# Altium schematic symbol library LATTICEPLDS_Library.SchLib: 291 symbols (part 10 of 32) (continued)
## LFE2M-35/50-F672 (continued)
part F pins: A3 PT13A (io), A4 PT13B (io), A5 PT14A (io), A6 PT14B (io), A7 PT19A (io), A8 PT22A (io), A9 PT24B (io), A10 PT32B / PT41B (io), A11 PT35A / PT44A (io), A12 PT35B / PT44B (io), B2 PT6B (io), B3 PT7B (io), B7 VCCIO0 (io), B8 PT19B (io), B9 PT22B (io), B10 PT32A / PT41A (io), B12 VCCIO0 (io), C3 PT4B (io), C4 PT6A (io), C5 PT7A (io), C6 PT12B (io), C7 PT17A (io), C8 PT16B (io), C9 PT20A (io), C10 PT23B (io), C11 PT36B / PT45B (io), C12 PT37B / PT46B (io), D4 PT4A (io), D5 PT10B (io), D6 PT17B (io), D7 PT11B (io), D8 PT15B (io), D9 PT18B (io), D10 PT29B / PT38B (io), D11 PT31B / PT40B (io), D12 PT34B / PT43B (io), D13 PT40A / PT49A (io), D14 PT40B / PT49B (io), D15 PT43A / PT52A (io), D16 PT45A / PT54A (io), D17 PT46A / PT55A (io), D18 VCCIO1 (io), E6 PT10A (io), E7 PT8A (io), E8 PT23A (io), E10 PT21A (io), E11 PT30B / PT39B (io), E12 PT39A / PT48A (io), E13 PT38A / PT47A (io), E14 PT41A / PT50A (io), E15 PT42A / PT51A (io), E16 PT43B / PT52B (io), E17 PT46B / PT55B (io), F7 PT5A (io), F8 PT3A (io), F9 PT9A (io), F10 PT12A (io), F11 VCCIO0 (io), F12 PT21B (io), F13 PT30A / PT39A (io), F14 PT36A / PT45A (io), F15 PT39B / PT48B (io), F16 VCCIO1 (io), F17 PT45B / PT54B (io), F18 PT44A / PT53A (io), F19 PT44B / PT53B (io), G7 PT2A (io), G8 PT2B (io), G9 PT5B (io), G10 PT9B (io), G12 PT16A (io), G13 PT20B (io), G14 PT31A / PT40A (io), G15 PT37A / PT46A (io), G17 PT41B / PT50B (io), G18 PT42B / PT51B (io), H10 PT8B (io), H11 PT11A (io), H12 PT15A (io), H13 PT18A (io), H14 PT29A / PT38A (io), H15 PT33A / PT42A (io), H16 PT34A / PT43A (io), H17 PT38B / PT47B (io), H18 PT33B / PT42B (io), J10 PT3B (io), J13 VCCIO0 (io), J14 VCCIO1 (io), K12 VCCIO0 (io), K15 VCCIO1 (io)
part A text: BANK7; (1 of 6); BANK6; Pad Name = PL{-35/-50}
part B text: BANK5; (2 of 6); BANK4; Pad Name = PB{-35/-50}
part C text: BANK8/3; (3 of 6); BANK2; Pad Name = PR{-35/-50}
part D text: (3 of 6); SERDES1
part E text: (4 of 6)
part F text: BANK1; (6 of 6); BANK0; Pad Name = PT{-35/-50}

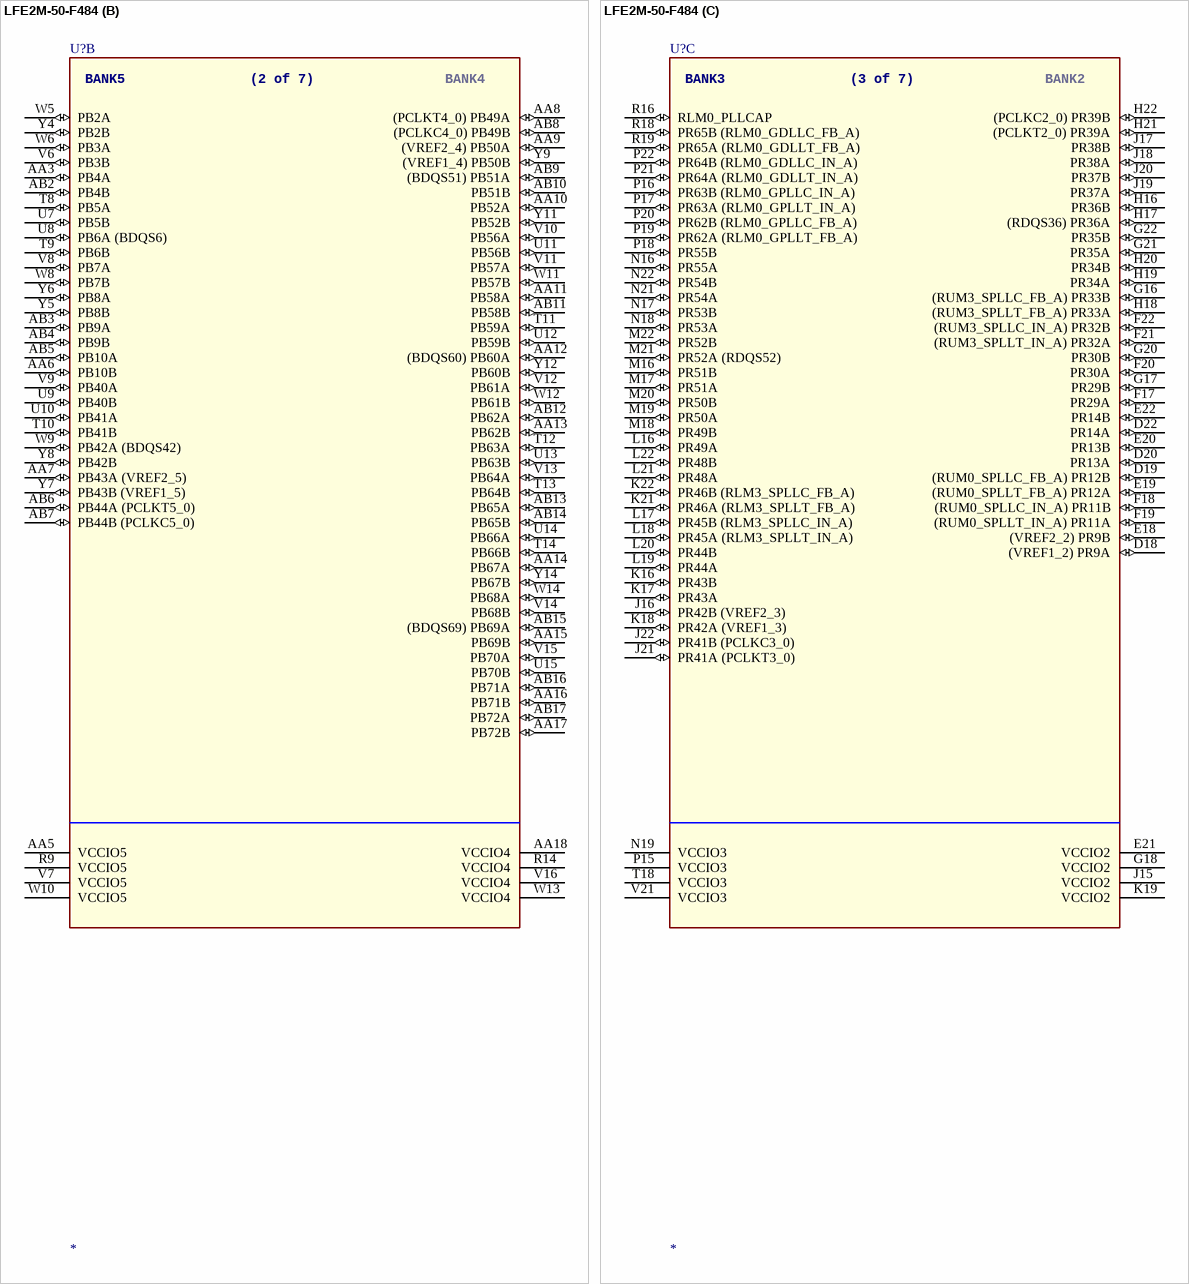
[diagram p105: symbol LFE2M-50-F484]

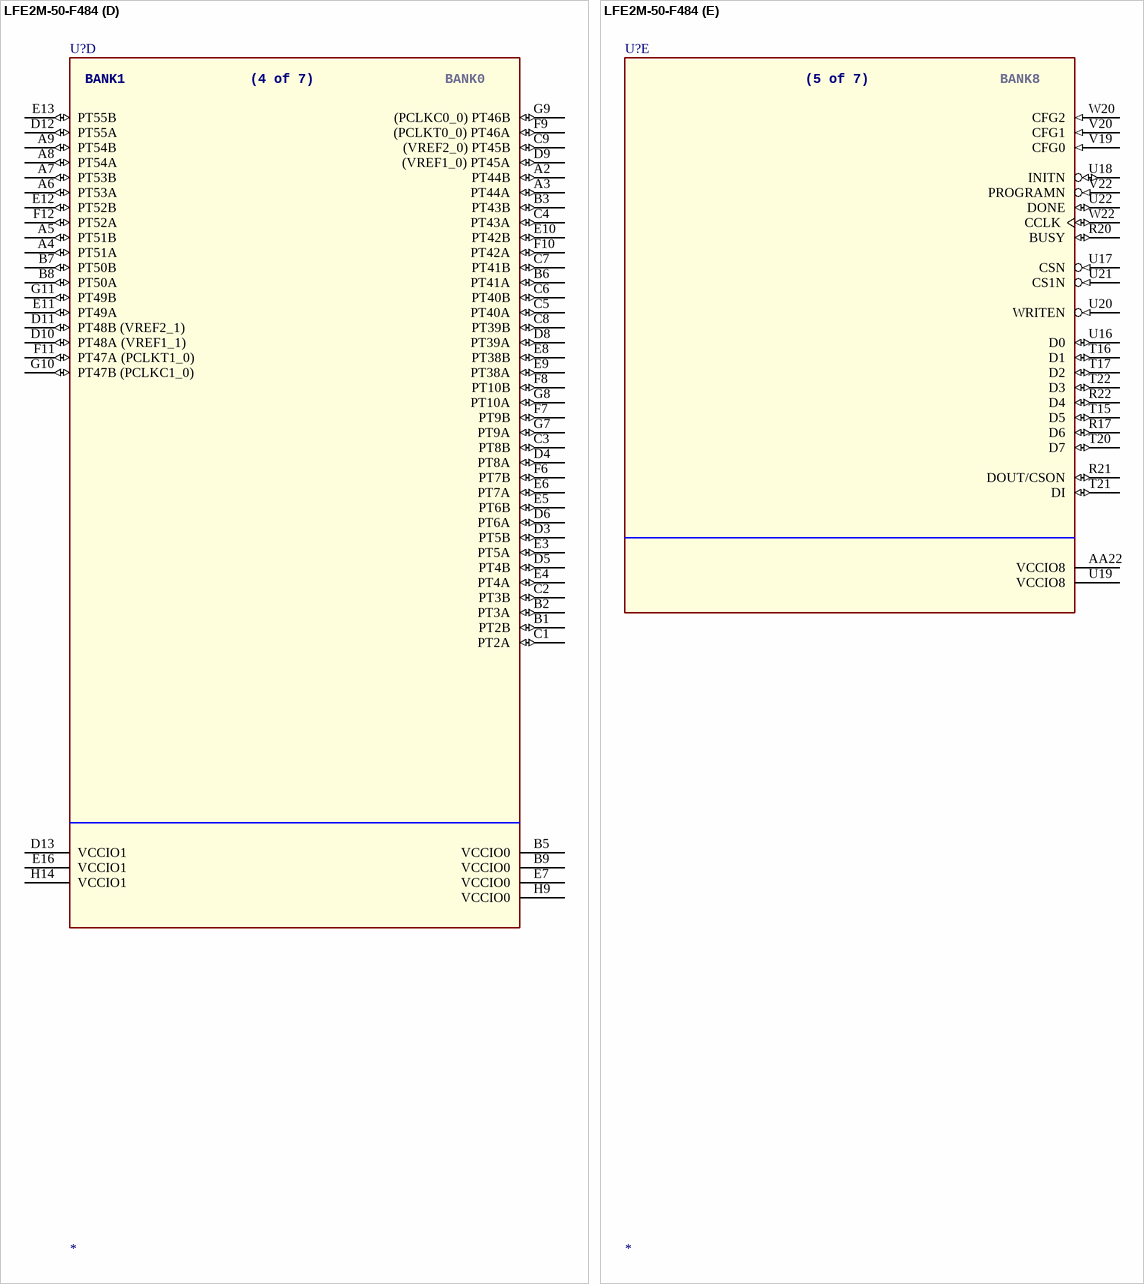
[diagram p106: symbol LFE2M-50-F484]

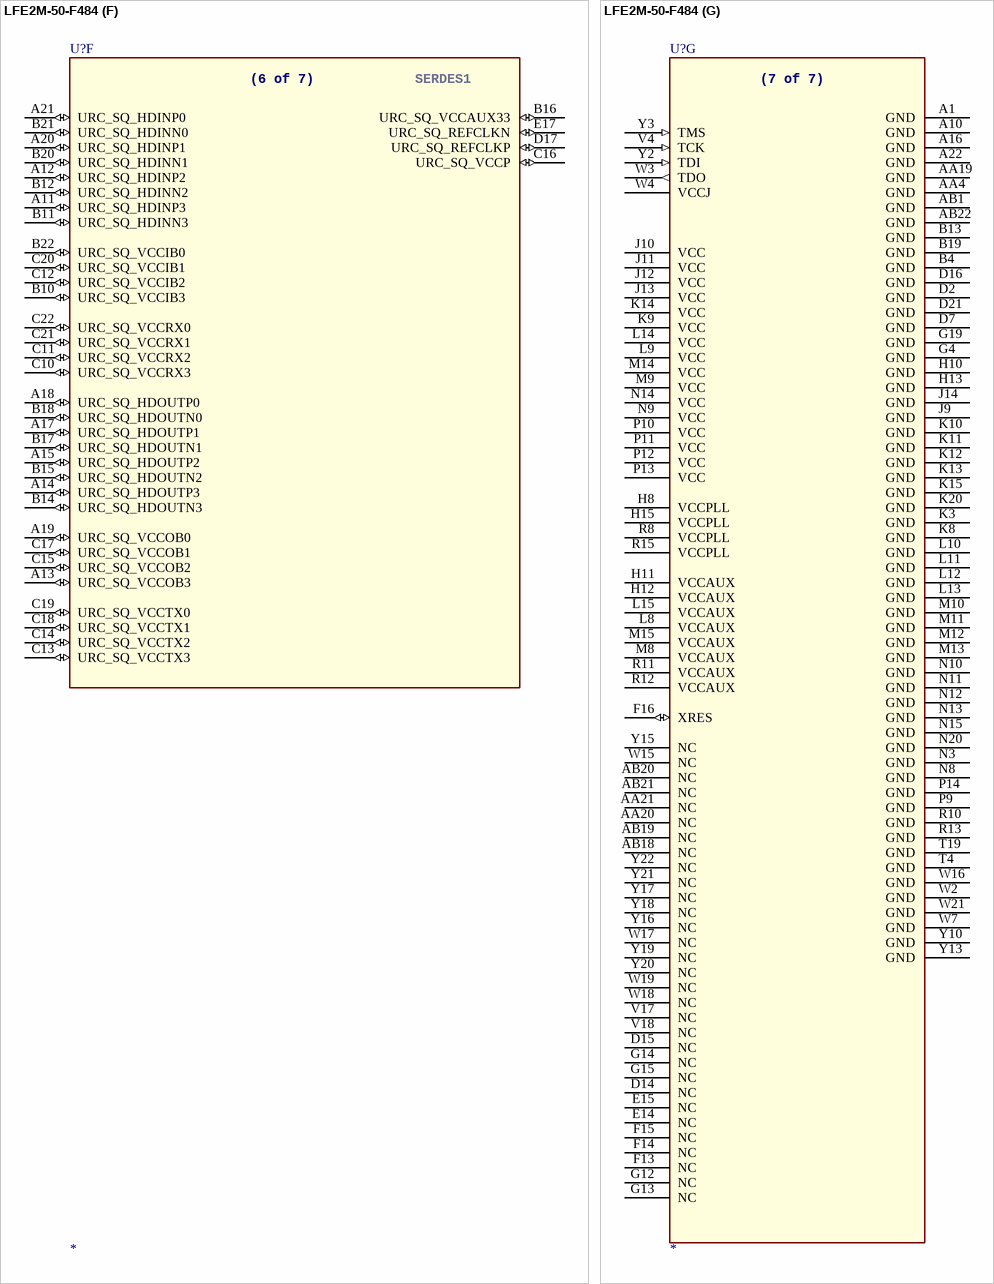
[diagram p107: symbol LFE2M-50-F484]

## LFE2M-50-F484
designator U?
SPLIT_INST: TRUE; SWAP_INFO: (S1+S2+S3+S4+S5+S6+S7)
part A pins: AA1 PL74A (io), AA2 PL74B (io), D1 PL2A (io), E1 PL2B (io), E2 VCCIO7 (power), F1 PL3A (io), F2 PL3B (io), F3 PL5B (io), F4 PL5A (io), F5 PL4A (io), G1 PL6A (LDQS6) (io), G2 PL6B (io), G3 PL9A (VREF2_7) (io), G5 VCCIO7 (power), G6 PL4B (io), H1 PL7A (io), H2 PL7B (io), H3 PL9B (VREF1_7) (io), H4 PL11B (LUM0_SPLLC_IN_A) (io), H5 PL11A (LUM0_SPLLT_IN_A) (io), H6 PL8B (io), H7 PL8A (io), J1 PL12A (LUM0_SPLLT_FB_A) (io), J2 PL12B (LUM0_SPLLC_FB_A) (io), J3 PL13A (io), J4 PL13B (io), J5 PL33A (LUM3_SPLLT_FB_A) (io), J6 PL14B (io), J7 PL14A (io), J8 VCCIO7 (power), K1 PL32A (LUM3_SPLLT_IN_A) (io), K2 PL32B (LUM3_SPLLC_IN_A) (io), K4 VCCIO7 (power), K5 PL33B (LUM3_SPLLC_FB_A) (io), K6 PL34B (io), K7 PL34A (io), L1 PL36A (LDQS36) (io), L2 PL36B (io), L3 PL38A (io), L4 PL38B (io), L5 PL37B (io), L6 PL35A (io), L7 PL35B (io), M1 PL39A (PCLKT7_0) (io), M2 PL39B (PCLKC7_0) (io), M3 (VREF2_6) PL42A (io), M4 (VREF1_6) PL42B (io), M5 (PCLKC6_0) PL41B (io), M6 (PCLKT6_0) PL41A (io), M7 PL37A (io), N1 (LLM3_SPLLT_FB_A) PL46A (io), N2 (LLM3_SPLLC_FB_A) PL46B (io), N4 VCCIO6 (power), N5 PL52B (io), N6 (LLM3_SPLLC_IN_A) PL45B (io), N7 (LLM3_SPLLT_IN_A) PL45A (io), P1 PL53A (io), P2 PL53B (io), P3 PL54A (io), P4 PL54B (io), P5 PL55A (io), P6 (LDQS52) PL52A (io), P7 PL55B (io), P8 VCCIO6 (power), R1 (LLM0_GPLLT_IN_A) PL62A (io), R2 (LLM0_GPLLC_IN_A) PL62B (io), R3 (LLM0_GPLLT_FB_A) PL63A (io), R4 (LLM0_GPLLC_FB_A) PL63B (io), R5 (LLM0_GDLLC_IN_A) PL64B (io), R6 (LLM0_GDLLT_IN_A) PL64A (io), R7 LLM0_PLLCAP (io), T1 (LLM0_GDLLT_FB_A) PL65A (io), T2 (LLM0_GDLLC_FB_A) PL65B (io), T3 PL69A (io), T5 VCCIO6 (power), T6 PL67A (io), T7 PL67B (io), U1 PL68A (io), U2 PL68B (io), U3 PL69B (io), U4 PL71B (io), U5 PL70B (io), U6 PL70A (io), V1 PL72A (io), V2 VCCIO6 (power), V3 PL72B (io), V5 (LDQS71) PL71A (io), W1 PL73A (io), Y1 PL73B (io)
part B pins: AA3 PB4A (io), AA5 VCCIO5 (power), AA6 PB10B (io), AA7 PB43A (VREF2_5) (io), AA8 (PCLKT4_0) PB49A (io), AA9 (VREF2_4) PB50A (io), AA10 PB52A (io), AA11 PB58A (io), AA12 (BDQS60) PB60A (io), AA13 PB62B (io), AA14 PB67A (io), AA15 PB69B (io), AA16 PB71B (io), AA17 PB72B (io), AA18 VCCIO4 (power), AB2 PB4B (io), AB3 PB9A (io), AB4 PB9B (io), AB5 PB10A (io), AB6 PB44A (PCLKT5_0) (io), AB7 PB44B (PCLKC5_0) (io), AB8 (PCLKC4_0) PB49B (io), AB9 (BDQS51) PB51A (io), AB10 PB51B (io), AB11 PB58B (io), AB12 PB62A (io), AB13 PB65A (io), AB14 PB65B (io), AB15 (BDQS69) PB69A (io), AB16 PB71A (io), AB17 PB72A (io), R9 VCCIO5 (power), R14 VCCIO4 (power), T8 PB5A (io), T9 PB6B (io), T10 PB41B (io), T11 PB59A (io), T12 PB63A (io), T13 PB64B (io), T14 PB66B (io), U7 PB5B (io), U8 PB6A (BDQS6) (io), U9 PB40B (io), U10 PB41A (io), U11 PB56B (io), U12 PB59B (io), U13 PB63B (io), U14 PB66A (io), U15 PB70B (io), V6 PB3B (io), V7 VCCIO5 (power), V8 PB7A (io), V9 PB40A (io), V10 PB56A (io), V11 PB57A (io), V12 PB61A (io), V13 PB64A (io), V14 PB68B (io), V15 PB70A (io), V16 VCCIO4 (power), W5 PB2A (io), W6 PB3A (io), W8 PB7B (io), W9 PB42A (BDQS42) (io), W10 VCCIO5 (power), W11 PB57B (io), W12 PB61B (io), W13 VCCIO4 (power), W14 PB68A (io), Y4 PB2B (io), Y5 PB8B (io), Y6 PB8A (io), Y7 PB43B (VREF1_5) (io), Y8 PB42B (io), Y9 (VREF1_4) PB50B (io), Y11 PB52B (io), Y12 PB60B (io), Y14 PB67B (io)
part C pins: D18 (VREF1_2) PR9A (io), D19 (RUM0_SPLLC_FB_A) PR12B (io), D20 PR13A (io), D22 PR14A (io), E18 (VREF2_2) PR9B (io), E19 (RUM0_SPLLT_FB_A) PR12A (io), E20 PR13B (io), E21 VCCIO2 (power), E22 PR14B (io), F17 PR29A (io), F18 (RUM0_SPLLC_IN_A) PR11B (io), F19 (RUM0_SPLLT_IN_A) PR11A (io), F20 PR30A (io), F21 (RUM3_SPLLT_IN_A) PR32A (io), F22 (RUM3_SPLLC_IN_A) PR32B (io), G16 (RUM3_SPLLC_FB_A) PR33B (io), G17 PR29B (io), G18 VCCIO2 (power), G20 PR30B (io), G21 PR35A (io), G22 PR35B (io), H16 PR36B (io), H17 (RDQS36) PR36A (io), H18 (RUM3_SPLLT_FB_A) PR33A (io), H19 PR34A (io), H20 PR34B (io), H21 (PCLKT2_0) PR39A (io), H22 (PCLKC2_0) PR39B (io), J15 VCCIO2 (power), J16 PR42B (VREF2_3) (io), J17 PR38B (io), J18 PR38A (io), J19 PR37A (io), J20 PR37B (io), J21 PR41A (PCLKT3_0) (io), J22 PR41B (PCLKC3_0) (io), K16 PR43B (io), K17 PR43A (io), K18 PR42A (VREF1_3) (io), K19 VCCIO2 (power), K21 PR46A (RLM3_SPLLT_FB_A) (io), K22 PR46B (RLM3_SPLLC_FB_A) (io), L16 PR49A (io), L17 PR45B (RLM3_SPLLC_IN_A) (io), L18 PR45A (RLM3_SPLLT_IN_A) (io), L19 PR44A (io), L20 PR44B (io), L21 PR48A (io), L22 PR48B (io), M16 PR51B (io), M17 PR51A (io), M18 PR49B (io), M19 PR50A (io), M20 PR50B (io), M21 PR52A (RDQS52) (io), M22 PR52B (io), N16 PR55A (io), N17 PR53B (io), N18 PR53A (io), N19 VCCIO3 (power), N21 PR54A (io), N22 PR54B (io), P15 VCCIO3 (power), P16 PR63B (RLM0_GPLLC_IN_A) (io), P17 PR63A (RLM0_GPLLT_IN_A) (io), P18 PR55B (io), P19 PR62A (RLM0_GPLLT_FB_A) (io), P20 PR62B (RLM0_GPLLC_FB_A) (io), P21 PR64A (RLM0_GDLLT_IN_A) (io), P22 PR64B (RLM0_GDLLC_IN_A) (io), R16 RLM0_PLLCAP (io), R18 PR65B (RLM0_GDLLC_FB_A) (io), R19 PR65A (RLM0_GDLLT_FB_A) (io), T18 VCCIO3 (power), V21 VCCIO3 (power)
part D pins: A2 PT44B (io), A3 PT44A (io), A4 PT51A (io), A5 PT51B (io), A6 PT53A (io), A7 PT53B (io), A8 PT54A (io), A9 PT54B (io), B1 PT2B (io), B2 PT3A (io), B3 PT43B (io), B5 VCCIO0 (power), B6 PT41A (io), B7 PT50B (io), B8 PT50A (io), B9 VCCIO0 (power), C1 PT2A (io), C2 PT3B (io), C3 PT8B (io), C4 PT43A (io), C5 PT40A (io), C6 PT40B (io), C7 PT41B (io), C8 PT39B (io), C9 (VREF2_0) PT45B (io), D3 PT5B (io), D4 PT8A (io), D5 PT4B (io), D6 PT6A (io), D8 PT39A (io), D9 (VREF1_0) PT45A (io), D10 PT48A (VREF1_1) (io), D11 PT48B (VREF2_1) (io), D12 PT55A (io), D13 VCCIO1 (power), E3 PT5A (io), E4 PT4A (io), E5 PT6B (io), E6 PT7A (io), E7 VCCIO0 (power), E8 PT38B (io), E9 PT38A (io), E10 PT42B (io), E11 PT49A (io), E12 PT52B (io), E13 PT55B (io), E16 VCCIO1 (power), F6 PT7B (io), F7 PT9B (io), F8 PT10B (io), F9 (PCLKT0_0) PT46A (io), F10 PT42A (io), F11 PT47A (PCLKT1_0) (io), F12 PT52A (io), G7 PT9A (io), G8 PT10A (io), G9 (PCLKC0_0) PT46B (io), G10 PT47B (PCLKC1_0) (io), G11 PT49B (io), H9 VCCIO0 (power), H14 VCCIO1 (power)
part E pins: AA22 VCCIO8 (power), R17 D6 (io), R20 BUSY (io), R21 DOUT/CSON (io), R22 D4 (io), T15 D5 (io), T16 D1 (io), T17 D2 (io), T20 D7 (io), T21 DI (io), T22 D3 (io), U16 D0 (io), U17 CSN (in), U18 INITN (io), U19 VCCIO8 (power), U20 WRITEN (in), U21 CS1N (in), U22 DONE (io), V19 CFG0 (in), V20 CFG1 (in), V22 PROGRAMN (in), W20 CFG2 (in), W22 CCLK (io)
part F pins: A11 URC_SQ_HDINP3 (io), A12 URC_SQ_HDINP2 (io), A13 URC_SQ_VCCOB3 (io), A14 URC_SQ_HDOUTP3 (io), A15 URC_SQ_HDOUTP2 (io), A17 URC_SQ_HDOUTP1 (io), A18 URC_SQ_HDOUTP0 (io), A19 URC_SQ_VCCOB0 (io), A20 URC_SQ_HDINP1 (io), A21 URC_SQ_HDINP0 (io), B10 URC_SQ_VCCIB3 (io), B11 URC_SQ_HDINN3 (io), B12 URC_SQ_HDINN2 (io), B14 URC_SQ_HDOUTN3 (io), B15 URC_SQ_HDOUTN2 (io), B16 URC_SQ_VCCAUX33 (io), B17 URC_SQ_HDOUTN1 (io), B18 URC_SQ_HDOUTN0 (io), B20 URC_SQ_HDINN1 (io), B21 URC_SQ_HDINN0 (io), B22 URC_SQ_VCCIB0 (io), C10 URC_SQ_VCCRX3 (io), C11 URC_SQ_VCCRX2 (io), C12 URC_SQ_VCCIB2 (io), C13 URC_SQ_VCCTX3 (io), C14 URC_SQ_VCCTX2 (io), C15 URC_SQ_VCCOB2 (io), C16 URC_SQ_VCCP (io), C17 URC_SQ_VCCOB1 (io), C18 URC_SQ_VCCTX1 (io), C19 URC_SQ_VCCTX0 (io), C20 URC_SQ_VCCIB1 (io), C21 URC_SQ_VCCRX1 (io), C22 URC_SQ_VCCRX0 (io), D17 URC_SQ_REFCLKP (io), E17 URC_SQ_REFCLKN (io)
part G pins: A1 GND (power), A10 GND (power), A16 GND (power), A22 GND (power), AA4 GND (power), AA19 GND (power), AA20 NC, AA21 NC, AB1 GND (power), AB18 NC, AB19 NC, AB20 NC, AB21 NC, AB22 GND (power), B4 GND (power), B13 GND (power), B19 GND (power), D2 GND (power), D7 GND (power), D14 NC, D15 NC, D16 GND (power), D21 GND (power), E14 NC, E15 NC, F13 NC, F14 NC, F15 NC, F16 XRES (io), G4 GND (power), G12 NC, G13 NC, G14 NC, G15 NC, G19 GND (power), H8 VCCPLL (power), H10 GND (power), H11 VCCAUX (power), H12 VCCAUX (power), H13 GND (power), H15 VCCPLL (power), J9 GND (power), J10 VCC (power), J11 VCC (power), J12 VCC (power), J13 VCC (power), J14 GND (power), K3 GND (power), K8 GND (power), K9 VCC (power), K10 GND (power), K11 GND (power), K12 GND (power), K13 GND (power), K14 VCC (power), K15 GND (power), K20 GND (power), L8 VCCAUX (power), L9 VCC (power), L10 GND (power), L11 GND (power), L12 GND (power), L13 GND (power), L14 VCC (power), L15 VCCAUX (power), M8 VCCAUX (power), M9 VCC (power), M10 GND (power), M11 GND (power), M12 GND (power), M13 GND (power), M14 VCC (power), M15 VCCAUX (power), N3 GND (power), N8 GND (power), N9 VCC (power), N10 GND (power), N11 GND (power), N12 GND (power), N13 GND (power), N14 VCC (power), N15 GND (power), N20 GND (power), P9 GND (power), P10 VCC (power), P11 VCC (power), P12 VCC (power), P13 VCC (power), P14 GND (power), R8 VCCPLL (power), R10 GND (power), R11 VCCAUX (power), R12 VCCAUX (power), R13 GND (power), R15 VCCPLL (power), T4 GND (power), T19 GND (power), V4 TCK (in), V17 NC, V18 NC, W2 GND (power), W3 TDO (out), W4 VCCJ (power), W7 GND (power), W15 NC, W16 GND (power), W17 NC, W18 NC, W19 NC, W21 GND (power), Y2 TDI (in), Y3 TMS (in), Y10 GND (power), Y13 GND (power), Y15 NC, Y16 NC, Y17 NC, Y18 NC, Y19 NC, Y20 NC, Y21 NC, Y22 NC
part A text: BANK7; (1 of 7); BANK6
part B text: BANK5; (2 of 7); BANK4
part C text: BANK3; (3 of 7); BANK2
part D text: BANK1; (4 of 7); BANK0
part E text: (5 of 7); BANK8
part F text: (6 of 7); SERDES1
part G text: (7 of 7)

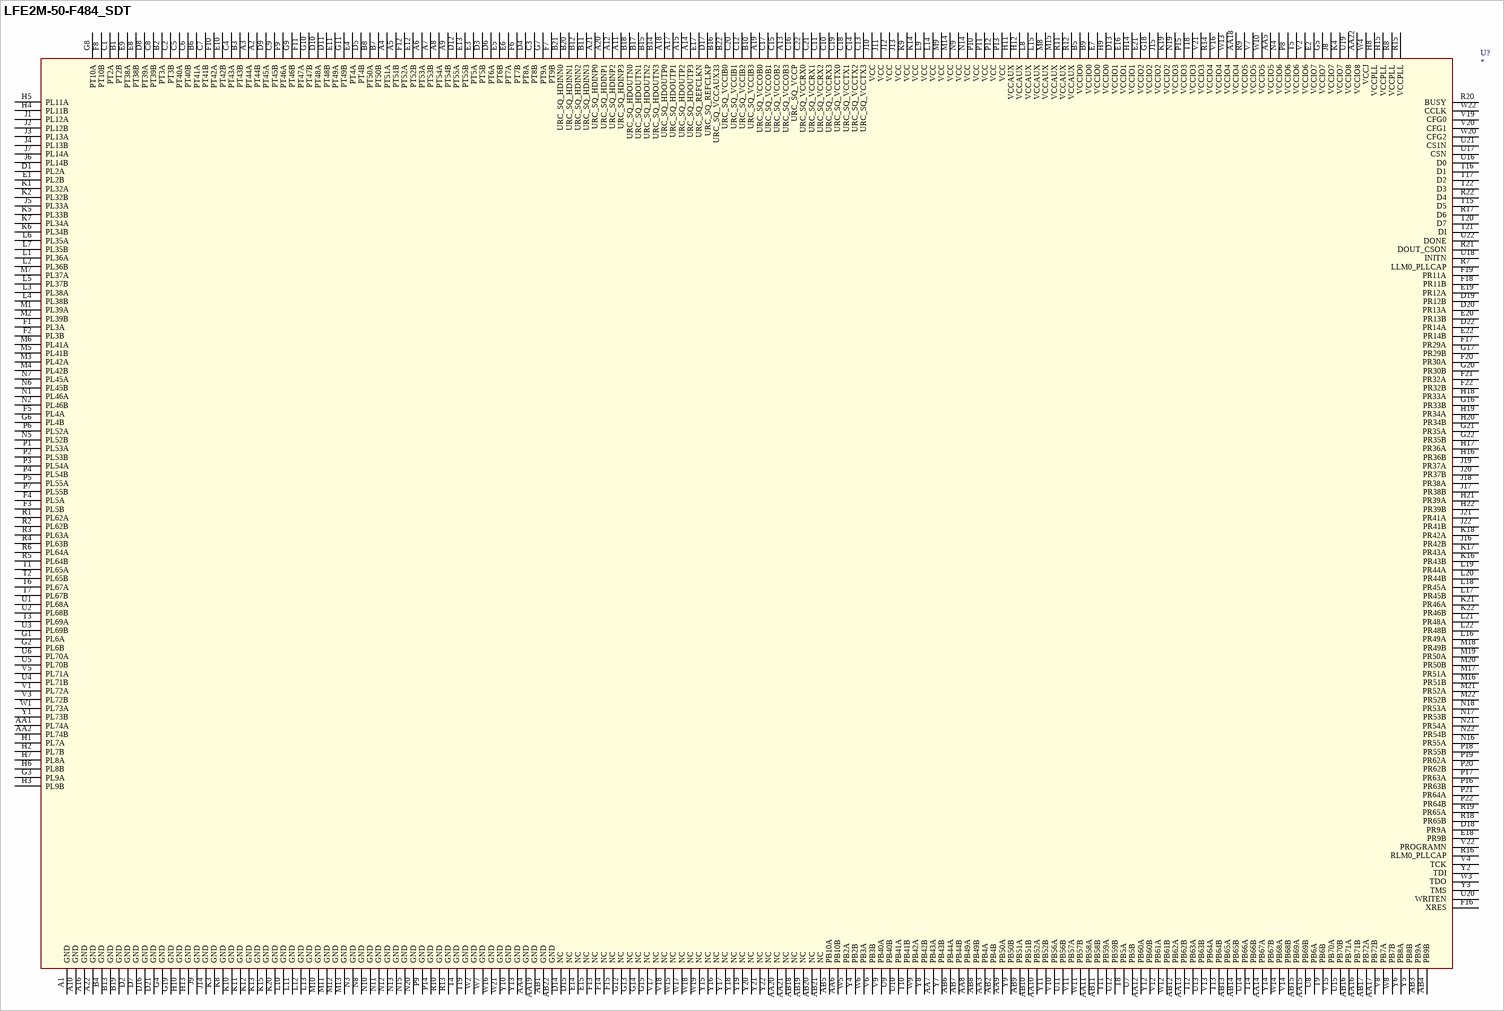
[diagram p108: symbol LFE2M-50-F484_SDT]

## LFE2M-50-F484_SDT
designator U?
pins: A1 GND, A2 PT44B, A3 PT44A, A4 PT51A, A5 PT51B, A6 PT53A, A7 PT53B, A8 PT54A, A9 PT54B, A10 GND, A11 URC_SQ_HDINP3, A12 URC_SQ_HDINP2, A13 URC_SQ_VCCOB3, A14 URC_SQ_HDOUTP3, A15 URC_SQ_HDOUTP2, A16 GND, A17 URC_SQ_HDOUTP1, A18 URC_SQ_HDOUTP0, A19 URC_SQ_VCCOB0, A20 URC_SQ_HDINP1, A21 URC_SQ_HDINP0, A22 GND, AA1 PL74A, AA2 PL74B, AA3 PB4A, AA4 GND, AA5 VCCIO5, AA6 PB10B, AA7 PB43A, AA8 PB49A, AA9 PB50A, AA10 PB52A, AA11 PB58A, AA12 PB60A, AA13 PB62B, AA14 PB67A, AA15 PB69B, AA16 PB71B, AA17 PB72B, AA18 VCCIO4, AA19 GND, AA20 NC, AA21 NC, AA22 VCCIO8, AB1 GND, AB2 PB4B, AB3 PB9A, AB4 PB9B, AB5 PB10A, AB6 PB44A, AB7 PB44B, AB8 PB49B, AB9 PB51A, AB10 PB51B, AB11 PB58B, AB12 PB62A, AB13 PB65A, AB14 PB65B, AB15 PB69A, AB16 PB71A, AB17 PB72A, AB18 NC, AB19 NC, AB20 NC, AB21 NC, AB22 GND, B1 PT2B, B2 PT3A, B3 PT43B, B4 GND, B5 VCCIO0, B6 PT41A, B7 PT50B, B8 PT50A, B9 VCCIO0, B10 URC_SQ_VCCIB3, B11 URC_SQ_HDINN3, B12 URC_SQ_HDINN2, B13 GND, B14 URC_SQ_HDOUTN3, B15 URC_SQ_HDOUTN2, B16 URC_SQ_VCCAUX33, B17 URC_SQ_HDOUTN1, B18 URC_SQ_HDOUTN0, B19 GND, B20 URC_SQ_HDINN1, B21 URC_SQ_HDINN0, B22 URC_SQ_VCCIB0, C1 PT2A, C2 PT3B, C3 PT8B, C4 PT43A, C5 PT40A, C6 PT40B, C7 PT41B, C8 PT39B, C9 PT45B, C10 URC_SQ_VCCRX3, C11 URC_SQ_VCCRX2, C12 URC_SQ_VCCIB2, C13 URC_SQ_VCCTX3, C14 URC_SQ_VCCTX2, C15 URC_SQ_VCCOB2, C16 URC_SQ_VCCP, C17 URC_SQ_VCCOB1, C18 URC_SQ_VCCTX1, C19 URC_SQ_VCCTX0, C20 URC_SQ_VCCIB1, C21 URC_SQ_VCCRX1, C22 URC_SQ_VCCRX0, D1 PL2A, D2 GND, D3 PT5B, D4 PT8A, D5 PT4B, D6 PT6A, D7 GND, D8 PT39A, D9 PT45A, D10 PT48A, D11 PT48B, D12 PT55A, D13 VCCIO1, D14 NC, D15 NC, D16 GND, D17 URC_SQ_REFCLKP, D18 PR9A, D19 PR12B, D20 PR13A, D21 GND, D22 PR14A, E1 PL2B, E2 VCCIO7, E3 PT5A, E4 PT4A, E5 PT6B, E6 PT7A, E7 VCCIO0, E8 PT38B, E9 PT38A, E10 PT42B, E11 PT49A, E12 PT52B, E13 PT55B, E14 NC, E15 NC, E16 VCCIO1, E17 URC_SQ_REFCLKN, E18 PR9B, E19 PR12A, E20 PR13B, E21 VCCIO2, E22 PR14B, F1 PL3A, F2 PL3B, F3 PL5B, F4 PL5A, F5 PL4A, F6 PT7B, F7 PT9B, F8 PT10B, F9 PT46A, F10 PT42A, F11 PT47A, F12 PT52A, F13 NC, F14 NC, F15 NC, F16 XRES, F17 PR29A, F18 PR11B, F19 PR11A, F20 PR30A, F21 PR32A, F22 PR32B, G1 PL6A, G2 PL6B, G3 PL9A, G4 GND, G5 VCCIO7, G6 PL4B, G7 PT9A, G8 PT10A, G9 PT46B, G10 PT47B, G11 PT49B, G12 NC, G13 NC, G14 NC, G15 NC, G16 PR33B, G17 PR29B, G18 VCCIO2, G19 GND, G20 PR30B, G21 PR35A, G22 PR35B, H1 PL7A, H2 PL7B, H3 PL9B, H4 PL11B, H5 PL11A, H6 PL8B, H7 PL8A, H8 VCCPLL, H9 VCCIO0, H10 GND, H11 VCCAUX, H12 VCCAUX, H13 GND, H14 VCCIO1, H15 VCCPLL, H16 PR36B, H17 PR36A, H18 PR33A, H19 PR34A, H20 PR34B, H21 PR39A, H22 PR39B, J1 PL12A, J2 PL12B, J3 PL13A, J4 PL13B, J5 PL33A, J6 PL14B, J7 PL14A, J8 VCCIO7, J9 GND, J10 VCC, J11 VCC, J12 VCC, J13 VCC, J14 GND, J15 VCCIO2, J16 PR42B, J17 PR38B, J18 PR38A, J19 PR37A, J20 PR37B, J21 PR41A, J22 PR41B, K1 PL32A, K2 PL32B, K3 GND, K4 VCCIO7, K5 PL33B, K6 PL34B, K7 PL34A, K8 GND, K9 VCC, K10 GND, K11 GND, K12 GND, K13 GND, K14 VCC, K15 GND, K16 PR43B, K17 PR43A, K18 PR42A, K19 VCCIO2, K20 GND, K21 PR46A, K22 PR46B, L1 PL36A, L2 PL36B, L3 PL38A, L4 PL38B, L5 PL37B, L6 PL35A, L7 PL35B, L8 VCCAUX, L9 VCC, L10 GND, L11 GND, L12 GND, L13 GND, L14 VCC, L15 VCCAUX, L16 PR49A, L17 PR45B, L18 PR45A, L19 PR44A, L20 PR44B, L21 PR48A, L22 PR48B, M1 PL39A, M2 PL39B, M3 PL42A, M4 PL42B, M5 PL41B, M6 PL41A, M7 PL37A, M8 VCCAUX, M9 VCC, M10 GND, M11 GND, M12 GND, M13 GND, M14 VCC, M15 VCCAUX, M16 PR51B, M17 PR51A, M18 PR49B, M19 PR50A, M20 PR50B, M21 PR52A, M22 PR52B, N1 PL46A, N2 PL46B, N3 GND, N4 VCCIO6, N5 PL52B, N6 PL45B, N7 PL45A, N8 GND, N9 VCC, N10 GND, N11 GND, N12 GND, N13 GND, N14 VCC, N15 GND, N16 PR55A, N17 PR53B, N18 PR53A, N19 VCCIO3, N20 GND, N21 PR54A, N22 PR54B, P1 PL53A, P2 PL53B, P3 PL54A, P4 PL54B, P5 PL55A, P6 PL52A, P7 PL55B, P8 VCCIO6, P9 GND, P10 VCC, P11 VCC, P12 VCC, P13 VCC, P14 GND, P15 VCCIO3, P16 PR63B, P17 PR63A, P18 PR55B, P19 PR62A, P20 PR62B, P21 PR64A, P22 PR64B, R1 PL62A, R2 PL62B, R3 PL63A, R4 PL63B, R5 PL64B, R6 PL64A, R7 LLM0_PLLCAP, R8 VCCPLL, R9 VCCIO5, R10 GND, R11 VCCAUX, R12 VCCAUX, R13 GND, R14 VCCIO4, R15 VCCPLL, R16 RLM0_PLLCAP, R17 D6, R18 PR65B, R19 PR65A, R20 BUSY, R21 DOUT_CSON, R22 D4, T1 PL65A, T2 PL65B, T3 PL69A, T4 GND, T5 VCCIO6, T6 PL67A, T7 PL67B, T8 PB5A, T9 PB6B, T10 PB41B, T11 PB59A, T12 PB63A, T13 PB64B, T14 PB66B, T15 D5, T16 D1, T17 D2, T18 VCCIO3, T19 GND, T20 D7, T21 DI, T22 D3, U1 PL68A, U2 PL68B, U3 PL69B, U4 PL71B, U5 PL70B, U6 PL70A, U7 PB5B, U8 PB6A, U9 PB40B, U10 PB41A, U11 PB56B, U12 PB59B, U13 PB63B, U14 PB66A, U15 PB70B, U16 D0, U17 CSN, U18 INITN, U19 VCCIO8, U20 WRITEN, U21 CS1N, U22 DONE, V1 PL72A, V2 VCCIO6, V3 PL72B, V4 TCK, V5 PL71A, V6 PB3B, V7 VCCIO5, V8 PB7A, V9 PB40A, V10 PB56A, V11 PB57A, V12 PB61A, V13 PB64A, V14 PB68B, V15 PB70A, V16 VCCIO4, V17 NC, V18 NC, V19 CFG0, V20 CFG1, V21 VCCIO3, V22 PROGRAMN, W1 PL73A, W2 GND, W3 TDO, W4 VCCJ, W5 PB2A, W6 PB3A, W7 GND, W8 PB7B, W9 PB42A, W10 VCCIO5, W11 PB57B, W12 PB61B, W13 VCCIO4, W14 PB68A, W15 NC, W16 GND, W17 NC, W18 NC, W19 NC, W20 CFG2, W21 GND, W22 CCLK, Y1 PL73B, Y2 TDI, Y3 TMS, Y4 PB2B, Y5 PB8B, Y6 PB8A, Y7 PB43B, Y8 PB42B, Y9 PB50B, Y10 GND, Y11 PB52B, Y12 PB60B, Y13 GND, Y14 PB67B, Y15 NC, Y16 NC, Y17 NC, Y18 NC, Y19 NC, Y20 NC, Y21 NC, Y22 NC

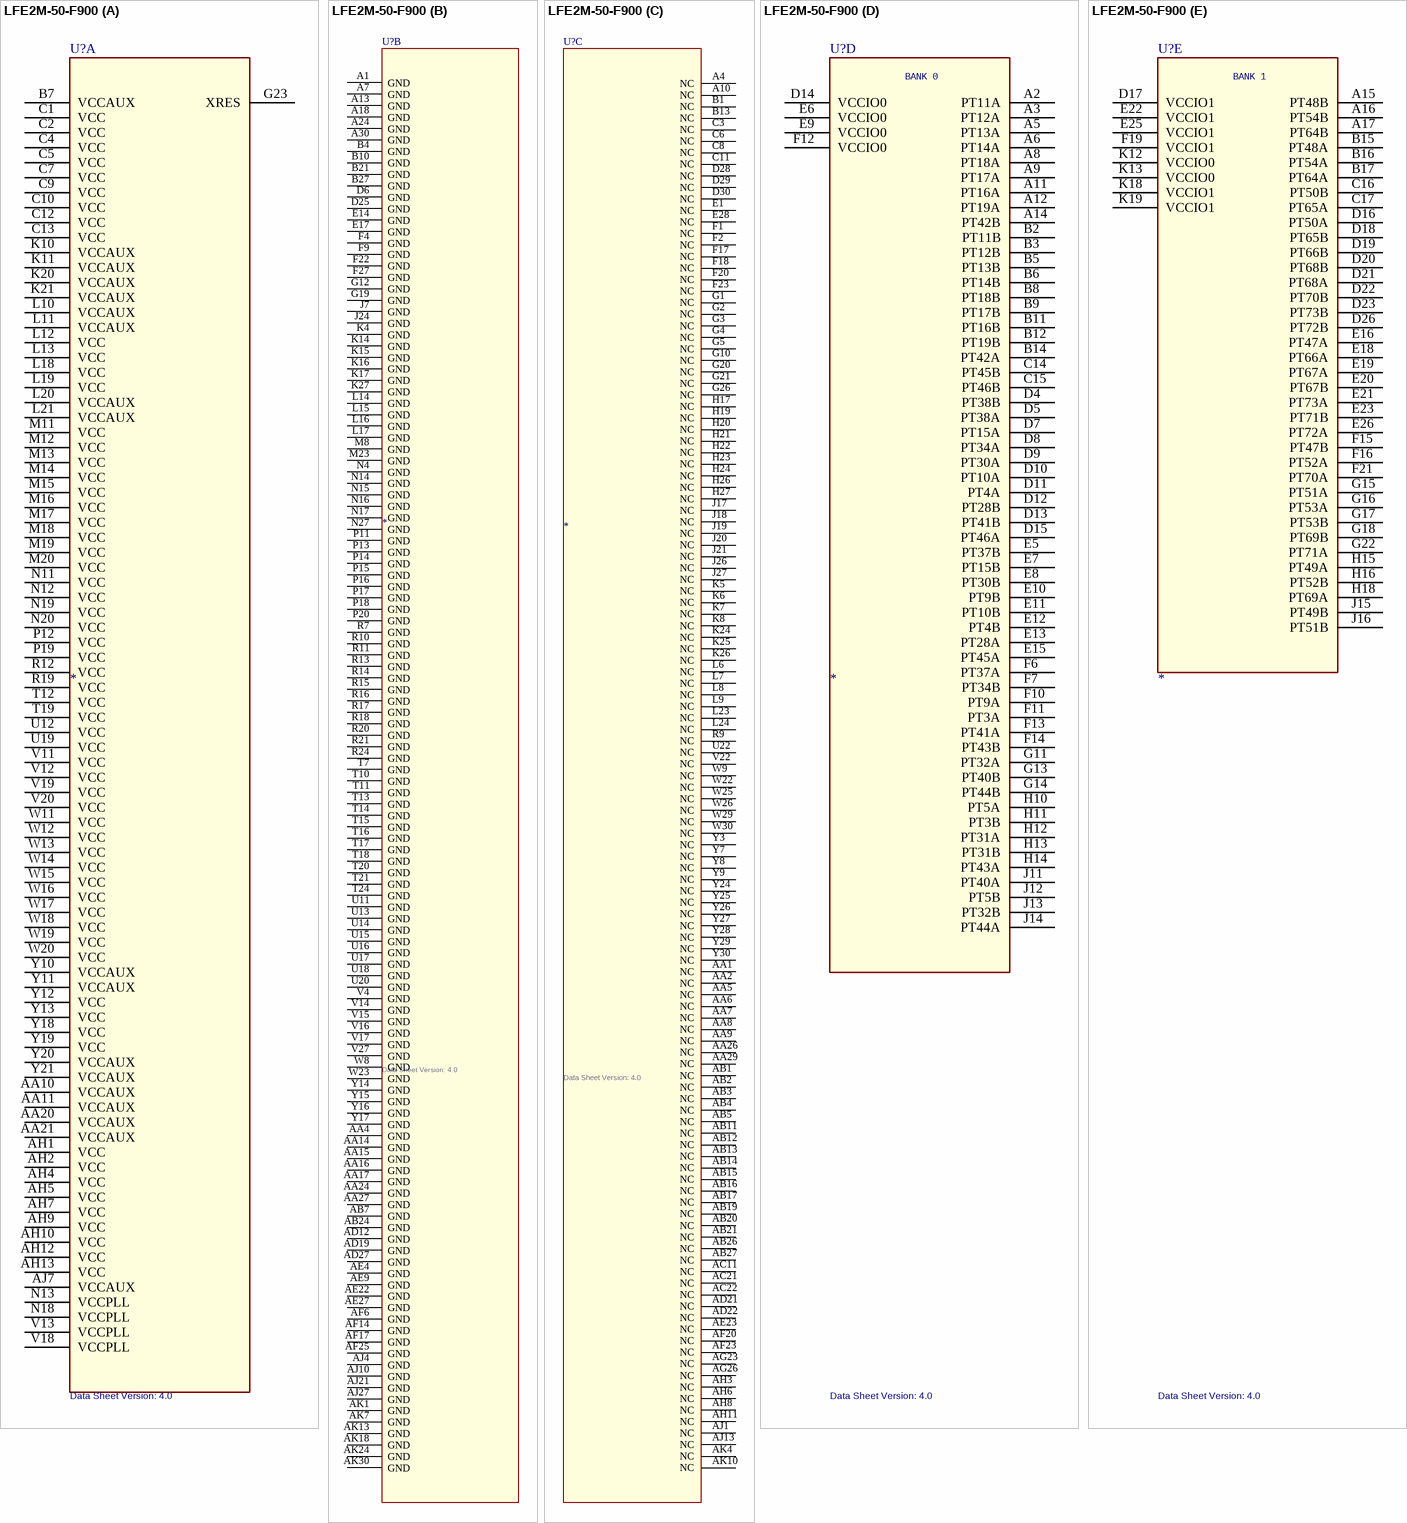
[diagram p109: symbol LFE2M-50-F900]
